# Altium footprint library Connectors Pad Lib.PcbLib: 211 footprints (part 8 of 14)
Each footprint in its own frame and in the unit in brackets; x right, y up, seen from the top. Pads: shape width x height; smd on the part's side, far side on the other; paste and mask are expansions set on the pad; w line width, h text height; cw(c..) or ccw(c..) is an arc to the next point about the centre after c.
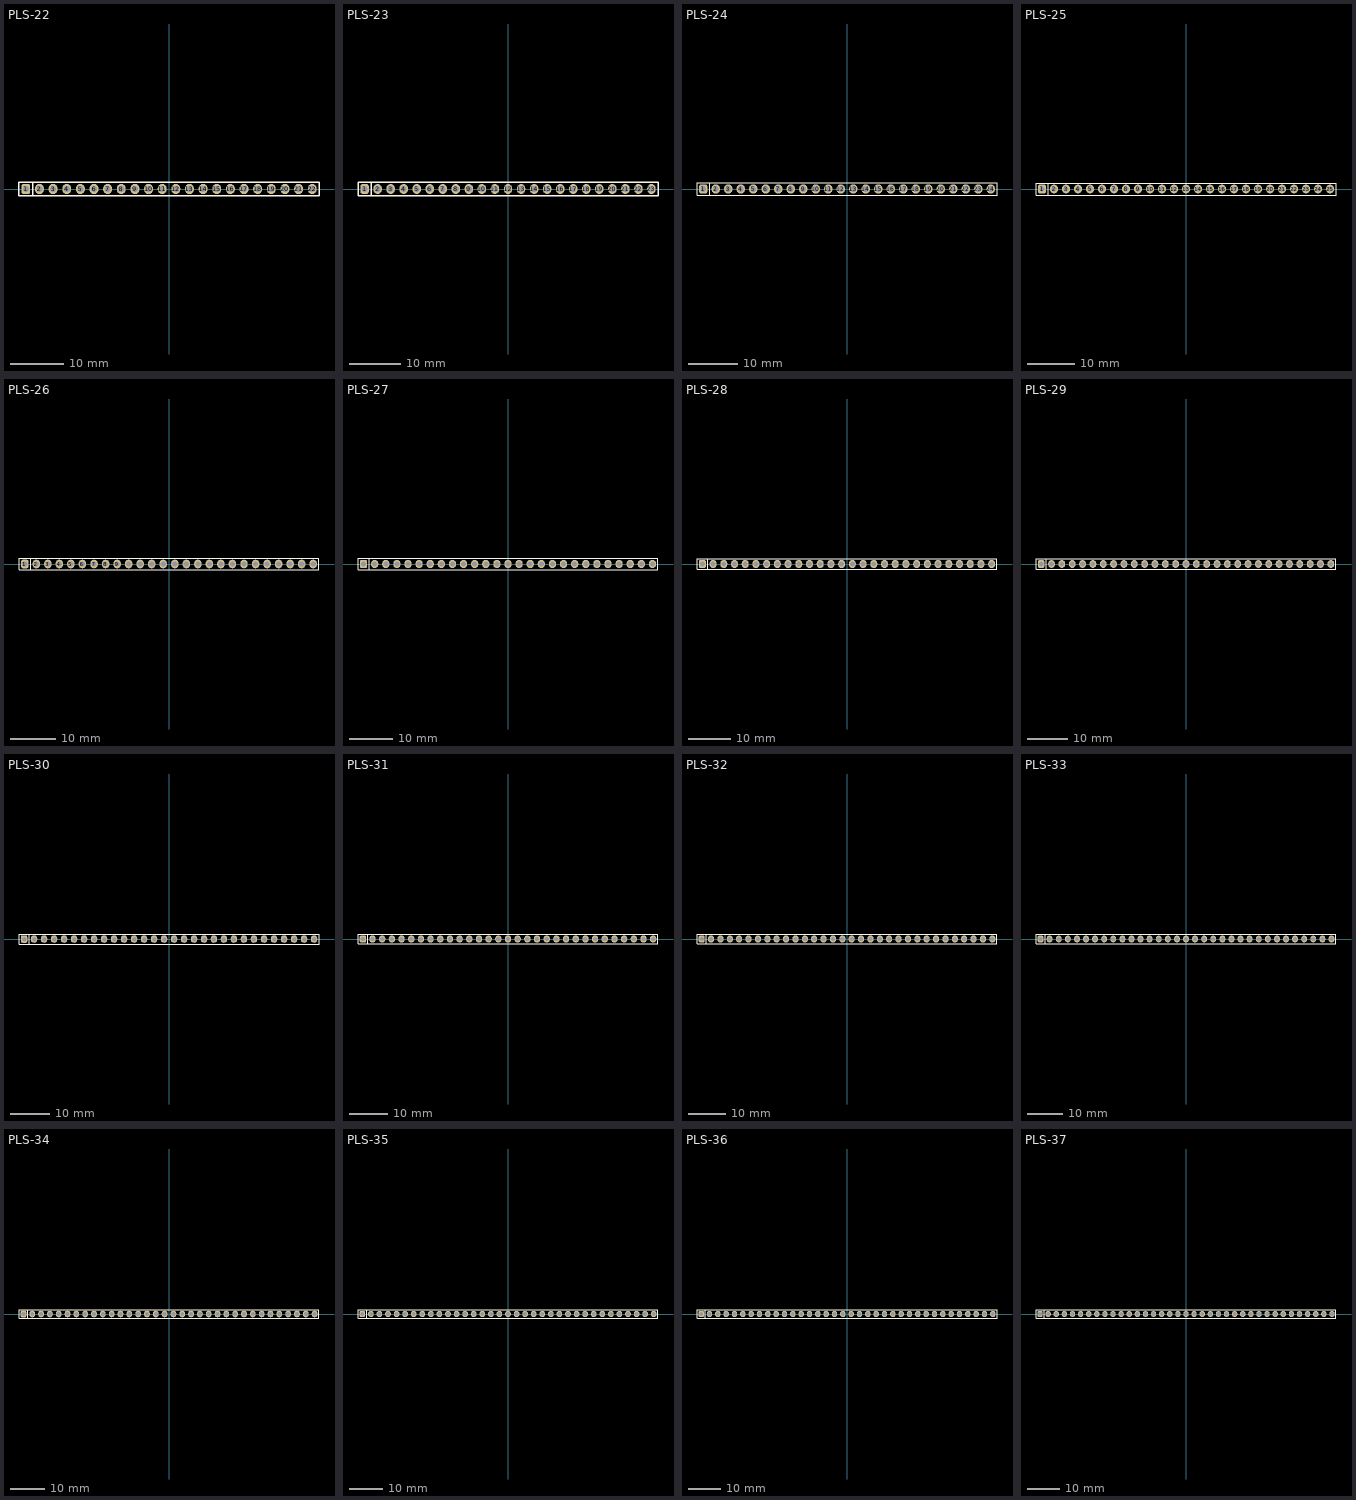
[diagram p7: the footprints below, top view; thin cyan lines are the x and y axes]

## PLS-22 [mil] "PCB Vertical Single Connector 22-Pin"
height 336.22
pads (22):
  rrect50% 65x75 hole 45: 1(-1050,0)
  oval 65x75 hole 45: 2(-950,0) 3(-850,0) 4(-750,0) 5(-650,0) 6(-550,0) 7(-450,0) 8(-350,0) 9(-250,0) 10(-150,0) 11(-50,0) 12(50,0) 13(150,0) 14(250,0) 15(350,0) 16(450,0) 17(550,0) 18(650,0) 19(750,0) 20(850,0) 21(950,0) 22(1050,0)
Top Overlay:
  lines w10: -1000,-50 -1000,50 ; -1100,-50 1100,-50 1100,50 -1100,50 -1100,-50
3D body "PLS-22.STEP": height 341.16, standoff -117.11, extent -1100,-50 1100,50

## PLS-23 [mil] "PCB Vertical Single Connector 23-Pin"
height 336.22
pads (23):
  rrect50% 65x75 hole 45: 1(-1100,0)
  oval 65x75 hole 45: 2(-1000,0) 3(-900,0) 4(-800,0) 5(-700,0) 6(-600,0) 7(-500,0) 8(-400,0) 9(-300,0) 10(-200,0) 11(-100,0) 12(0,0) 13(100,0) 14(200,0) 15(300,0) 16(400,0) 17(500,0) 18(600,0) 19(700,0) 20(800,0) 21(900,0) 22(1000,0) 23(1100,0)
Top Overlay:
  lines w10: -1050,-50 -1050,50 ; -1150,-50 -1150,50 1150,50 1150,-50 -1150,-50
3D body "PLS-23.STEP": height 341.16, standoff -117.11, extent -1150,-50 1150,50

## PLS-24 [mil] "PCB Vertical Single Connector 24-Pin"
height 336.22
pads (24):
  rrect50% 65x75 hole 45: 1(-1150,0)
  oval 65x75 hole 45: 2(-1050,0) 3(-950,0) 4(-850,0) 5(-750,0) 6(-650,0) 7(-550,0) 8(-450,0) 9(-350,0) 10(-250,0) 11(-150,0) 12(-50,0) 13(50,0) 14(150,0) 15(250,0) 16(350,0) 17(450,0) 18(550,0) 19(650,0) 20(750,0) 21(850,0) 22(950,0) 23(1050,0) 24(1150,0)
Top Overlay:
  lines w10: -1100,-50 -1100,50 ; -1200,-50 -1200,50 1200,50 1200,-50 -1200,-50
3D body "PLS-24.STEP": height 341.16, standoff -117.11, extent -1200,-50 1200,50

## PLS-25 [mil] "PCB Vertical Single Connector 25-Pin"
height 336.22
pads (25):
  rrect50% 65x75 hole 45: 1(-1200,0)
  oval 65x75 hole 45: 2(-1100,0) 3(-1000,0) 4(-900,0) 5(-800,0) 6(-700,0) 7(-600,0) 8(-500,0) 9(-400,0) 10(-300,0) 11(-200,0) 12(-100,0) 13(0,0) 14(100,0) 15(200,0) 16(300,0) 17(400,0) 18(500,0) 19(600,0) 20(700,0) 21(800,0) 22(900,0) 23(1000,0) 24(1100,0) 25(1200,0)
Top Overlay:
  lines w10: -1150,-50 -1150,50 ; -1250,-50 1250,-50 1250,50 -1250,50 -1250,-50
3D body "PLS-25.STEP": height 341.16, standoff -117.11, extent -1250,-50 1250,50

## PLS-26 [mil] "PCB Vertical Single Connector 26-Pin"
height 336.22
pads (26):
  rrect50% 65x75 hole 45: 1(-1250,0)
  oval 65x75 hole 45: 2(-1150,0) 3(-1050,0) 4(-950,0) 5(-850,0) 6(-750,0) 7(-650,0) 8(-550,0) 9(-450,0) 10(-350,0) 11(-250,0) 12(-150,0) 13(-50,0) 14(50,0) 15(150,0) 16(250,0) 17(350,0) 18(450,0) 19(550,0) 20(650,0) 21(750,0) 22(850,0) 23(950,0) 24(1050,0) 25(1150,0) 26(1250,0)
Top Overlay:
  lines w10: -1200,-50 -1200,50 ; -1300,-50 1300,-50 1300,50 -1300,50 -1300,-50
3D body "PLS-26.STEP": height 341.16, standoff -117.11, extent -1300,-50 1300,50

## PLS-27 [mil] "PCB Vertical Single Connector 27-Pin"
height 336.22
pads (27):
  rrect50% 65x75 hole 45: 1(-1300,0)
  oval 65x75 hole 45: 2(-1200,0) 3(-1100,0) 4(-1000,0) 5(-900,0) 6(-800,0) 7(-700,0) 8(-600,0) 9(-500,0) 10(-400,0) 11(-300,0) 12(-200,0) 13(-100,0) 14(0,0) 15(100,0) 16(200,0) 17(300,0) 18(400,0) 19(500,0) 20(600,0) 21(700,0) 22(800,0) 23(900,0) 24(1000,0) 25(1100,0) 26(1200,0) 27(1300,0)
Top Overlay:
  lines w10: -1250,-50 -1250,50 ; -1350,-50 1350,-50 1350,50 -1350,50 -1350,-50
3D body "PLS-27.STEP": height 341.16, standoff -117.11, extent -1350,-50 1350,50

## PLS-28 [mil] "PCB Vertical Single Connector 28-Pin"
height 336.22
pads (28):
  rrect50% 65x75 hole 45: 1(-1350,0)
  oval 65x75 hole 45: 2(-1250,0) 3(-1150,0) 4(-1050,0) 5(-950,0) 6(-850,0) 7(-750,0) 8(-650,0) 9(-550,0) 10(-450,0) 11(-350,0) 12(-250,0) 13(-150,0) 14(-50,0) 15(50,0) 16(150,0) 17(250,0) 18(350,0) 19(450,0) 20(550,0) 21(650,0) 22(750,0) 23(850,0) 24(950,0) 25(1050,0) 26(1150,0) 27(1250,0) 28(1350,0)
Top Overlay:
  lines w10: -1300,-50 -1300,50 ; -1400,-50 -1400,50 1400,50 1400,-50 -1400,-50
3D body "PLS-28.STEP": height 341.16, standoff -117.11, extent -1400,-50 1400,50

## PLS-29 [mil] "PCB Vertical Single Connector 29-Pin"
height 336.22
pads (29):
  rrect50% 65x75 hole 45: 1(-1400,0)
  oval 65x75 hole 45: 2(-1300,0) 3(-1200,0) 4(-1100,0) 5(-1000,0) 6(-900,0) 7(-800,0) 8(-700,0) 9(-600,0) 10(-500,0) 11(-400,0) 12(-300,0) 13(-200,0) 14(-100,0) 15(0,0) 16(100,0) 17(200,0) 18(300,0) 19(400,0) 20(500,0) 21(600,0) 22(700,0) 23(800,0) 24(900,0) 25(1000,0) 26(1100,0) 27(1200,0) 28(1300,0) 29(1400,0)
Top Overlay:
  lines w10: -1350,-50 -1350,50 ; -1450,-50 -1450,50 1450,50 1450,-50 -1450,-50
3D body "PLS-29.STEP": height 341.16, standoff -117.11, extent -1450,-50 1450,50

## PLS-30 [mil] "PCB Vertical Single Connector 30-Pin"
height 336.22
pads (30):
  rrect50% 65x75 hole 45: 1(-1450,0)
  oval 65x75 hole 45: 2(-1350,0) 3(-1250,0) 4(-1150,0) 5(-1050,0) 6(-950,0) 7(-850,0) 8(-750,0) 9(-650,0) 10(-550,0) 11(-450,0) 12(-350,0) 13(-250,0) 14(-150,0) 15(-50,0) 16(50,0) 17(150,0) 18(250,0) 19(350,0) 20(450,0) 21(550,0) 22(650,0) 23(750,0) 24(850,0) 25(950,0) 26(1050,0) 27(1150,0) 28(1250,0) 29(1350,0) 30(1450,0)
Top Overlay:
  lines w10: -1400,-50 -1400,50 ; -1500,-50 -1500,50 1500,50 1500,-50 -1500,-50
3D body "PLS-30.STEP": height 341.16, standoff -117.11, extent -1500,-50 1500,50

## PLS-31 [mil] "PCB Vertical Single Connector 31-Pin"
height 336.22
pads (31):
  rrect50% 65x75 hole 45: 1(-1500,0)
  oval 65x75 hole 45: 2(-1400,0) 3(-1300,0) 4(-1200,0) 5(-1100,0) 6(-1000,0) 7(-900,0) 8(-800,0) 9(-700,0) 10(-600,0) 11(-500,0) 12(-400,0) 13(-300,0) 14(-200,0) 15(-100,0) 16(0,0) 17(100,0) 18(200,0) 19(300,0) 20(400,0) 21(500,0) 22(600,0) 23(700,0) 24(800,0) 25(900,0) 26(1000,0) 27(1100,0) 28(1200,0) 29(1300,0) 30(1400,0) 31(1500,0)
Top Overlay:
  lines w10: -1450,-50 -1450,50 ; -1550,-50 1550,-50 1550,50 -1550,50 -1550,-50
3D body "PLS-31.STEP": height 341.16, standoff -117.11, extent -1550,-50 1550,50

## PLS-32 [mil] "PCB Vertical Single Connector 32-Pin"
height 336.22
pads (32):
  rrect50% 65x75 hole 45: 1(-1550,0)
  oval 65x75 hole 45: 2(-1450,0) 3(-1350,0) 4(-1250,0) 5(-1150,0) 6(-1050,0) 7(-950,0) 8(-850,0) 9(-750,0) 10(-650,0) 11(-550,0) 12(-450,0) 13(-350,0) 14(-250,0) 15(-150,0) 16(-50,0) 17(50,0) 18(150,0) 19(250,0) 20(350,0) 21(450,0) 22(550,0) 23(650,0) 24(750,0) 25(850,0) 26(950,0) 27(1050,0) 28(1150,0) 29(1250,0) 30(1350,0) 31(1450,0) 32(1550,0)
Top Overlay:
  lines w10: -1500,-50 -1500,50 ; -1600,-50 1600,-50 1600,50 -1600,50 -1600,-50
3D body "PLS-32.STEP": height 341.16, standoff -117.11, extent -1600,-50 1600,50

## PLS-33 [mil] "PCB Vertical Single Connector 33-Pin"
height 336.22
pads (33):
  rrect50% 65x75 hole 45: 1(-1600,0)
  oval 65x75 hole 45: 2(-1500,0) 3(-1400,0) 4(-1300,0) 5(-1200,0) 6(-1100,0) 7(-1000,0) 8(-900,0) 9(-800,0) 10(-700,0) 11(-600,0) 12(-500,0) 13(-400,0) 14(-300,0) 15(-200,0) 16(-100,0) 17(0,0) 18(100,0) 19(200,0) 20(300,0) 21(400,0) 22(500,0) 23(600,0) 24(700,0) 25(800,0) 26(900,0) 27(1000,0) 28(1100,0) 29(1200,0) 30(1300,0) 31(1400,0) 32(1500,0) 33(1600,0)
Top Overlay:
  lines w10: -1550,-50 -1550,50 ; -1650,-50 -1650,50 1650,50 1650,-50 -1650,-50
3D body "PLS-33.STEP": height 341.16, standoff -117.11, extent -1650,-50 1650,50

## PLS-34 [mil] "PCB Vertical Single Connector 34-Pin"
height 336.22
pads (34):
  rrect50% 65x75 hole 45: 1(-1650,0)
  oval 65x75 hole 45: 2(-1550,0) 3(-1450,0) 4(-1350,0) 5(-1250,0) 6(-1150,0) 7(-1050,0) 8(-950,0) 9(-850,0) 10(-750,0) 11(-650,0) 12(-550,0) 13(-450,0) 14(-350,0) 15(-250,0) 16(-150,0) 17(-50,0) 18(50,0) 19(150,0) 20(250,0) 21(350,0) 22(450,0) 23(550,0) 24(650,0) 25(750,0) 26(850,0) 27(950,0) 28(1050,0) 29(1150,0) 30(1250,0) 31(1350,0) 32(1450,0) 33(1550,0) 34(1650,0)
Top Overlay:
  lines w10: -1600,-50 -1600,50 ; -1700,-50 -1700,50 1700,50 1700,-50 -1700,-50
3D body "PLS-34.STEP": height 341.16, standoff -117.11, extent -1700,-50 1700,50

## PLS-35 [mil] "PCB Vertical Single Connector 35-Pin"
height 336.22
pads (35):
  rrect50% 65x75 hole 45: 1(-1700,0)
  oval 65x75 hole 45: 2(-1600,0) 3(-1500,0) 4(-1400,0) 5(-1300,0) 6(-1200,0) 7(-1100,0) 8(-1000,0) 9(-900,0) 10(-800,0) 11(-700,0) 12(-600,0) 13(-500,0) 14(-400,0) 15(-300,0) 16(-200,0) 17(-100,0) 18(0,0) 19(100,0) 20(200,0) 21(300,0) 22(400,0) 23(500,0) 24(600,0) 25(700,0) 26(800,0) 27(900,0) 28(1000,0) 29(1100,0) 30(1200,0) 31(1300,0) 32(1400,0) 33(1500,0) 34(1600,0) 35(1700,0)
Top Overlay:
  lines w10: -1650,-50 -1650,50 ; -1750,-50 -1750,50 1750,50 1750,-50 -1750,-50
3D body "PLS-35.STEP": height 341.16, standoff -117.11, extent -1750,-50 1750,50

## PLS-36 [mil] "PCB Vertical Single Connector 36-Pin"
height 336.22
pads (36):
  rrect50% 65x75 hole 45: 1(-1750,0)
  oval 65x75 hole 45: 2(-1650,0) 3(-1550,0) 4(-1450,0) 5(-1350,0) 6(-1250,0) 7(-1150,0) 8(-1050,0) 9(-950,0) 10(-850,0) 11(-750,0) 12(-650,0) 13(-550,0) 14(-450,0) 15(-350,0) 16(-250,0) 17(-150,0) 18(-50,0) 19(50,0) 20(150,0) 21(250,0) 22(350,0) 23(450,0) 24(550,0) 25(650,0) 26(750,0) 27(850,0) 28(950,0) 29(1050,0) 30(1150,0) 31(1250,0) 32(1350,0) 33(1450,0) 34(1550,0) 35(1650,0) 36(1750,0)
Top Overlay:
  lines w10: -1700,-50 -1700,50 ; -1800,-50 1800,-50 1800,50 -1800,50 -1800,-50
3D body "PLS-36.STEP": height 341.16, standoff -117.11, extent -1800,-50 1800,50

## PLS-37 [mil] "PCB Vertical Single Connector 37-Pin"
height 336.22
pads (37):
  rrect50% 65x75 hole 45: 1(-1800,0)
  oval 65x75 hole 45: 2(-1700,0) 3(-1600,0) 4(-1500,0) 5(-1400,0) 6(-1300,0) 7(-1200,0) 8(-1100,0) 9(-1000,0) 10(-900,0) 11(-800,0) 12(-700,0) 13(-600,0) 14(-500,0) 15(-400,0) 16(-300,0) 17(-200,0) 18(-100,0) 19(0,0) 20(100,0) 21(200,0) 22(300,0) 23(400,0) 24(500,0) 25(600,0) 26(700,0) 27(800,0) 28(900,0) 29(1000,0) 30(1100,0) 31(1200,0) 32(1300,0) 33(1400,0) 34(1500,0) 35(1600,0) 36(1700,0) 37(1800,0)
Top Overlay:
  lines w10: -1750,-50 -1750,50 ; -1850,-50 -1850,50 1850,50 1850,-50 -1850,-50
3D body "PLS-37.STEP": height 341.16, standoff -117.11, extent -1850,-50 1850,50